# Altium footprint library Package_SO.PcbLib: 333 footprints (part 9 of 21)
Each footprint in its own frame and in the unit in brackets; x right, y up, seen from the top. Pads: shape width x height; smd on the part's side, far side on the other; paste and mask are expansions set on the pad; w line width, h text height; cw(c..) or ccw(c..) is an arc to the next point about the centre after c.
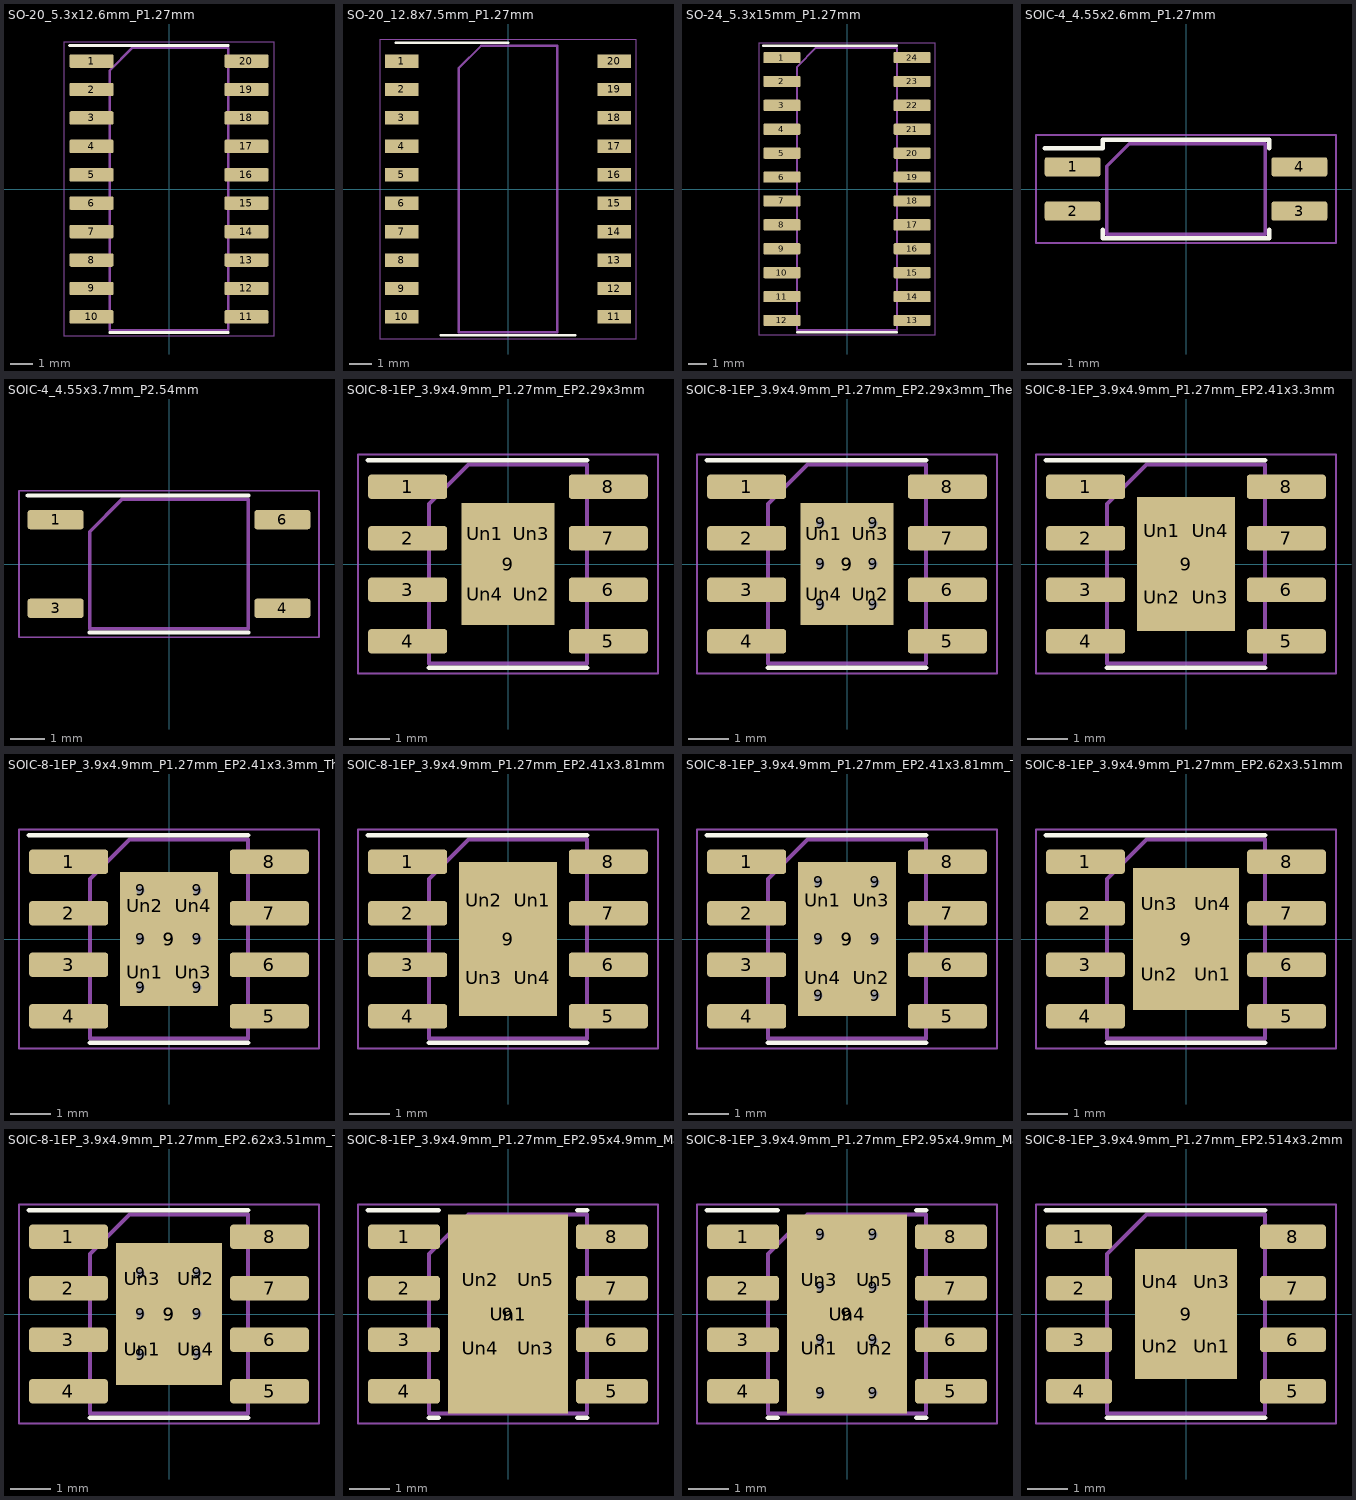
[diagram p8: the footprints below, top view; thin cyan lines are the x and y axes]

## SO-20_5.3x12.6mm_P1.27mm [mm]
pads (20):
  rrect25% 1.975x0.6 smd: 1(-3.463,5.715) 2(-3.463,4.445) 3(-3.463,3.175) 4(-3.463,1.905) 5(-3.463,0.635) 6(-3.463,-0.635) 7(-3.463,-1.905) 8(-3.463,-3.175) 9(-3.463,-4.445) 10(-3.463,-5.715) 11(3.463,-5.715) 12(3.463,-4.445) 13(3.463,-3.175) 14(3.463,-1.905) 15(3.463,-0.635) 16(3.463,0.635) 17(3.463,1.905) 18(3.463,3.175) 19(3.463,4.445) 20(3.463,5.715)
F.SilkS:
  lines w0.12: -4.45,6.41 0,6.41 2.65,6.41 ; -2.65,-6.41 0,-6.41 2.65,-6.41
F.CrtYd:
  lines w0.05: -4.7,-6.55 -4.7,6.55 4.7,6.55 4.7,-6.55 -4.7,-6.55
F.Fab:
  lines w0.1: -2.65,-6.3 -2.65,5.3 -1.65,6.3 2.65,6.3 2.65,-6.3 -2.65,-6.3
  text "'.Designator'" at -4.047,-0.84 h1

## SO-20_12.8x7.5mm_P1.27mm [mm]
pads (20):
  rect 1.5x0.6 smd: 1(-4.75,5.715) 2(-4.75,4.445) 3(-4.75,3.175) 4(-4.75,1.905) 5(-4.75,0.635) 6(-4.75,-0.635) 7(-4.75,-1.905) 8(-4.75,-3.175) 9(-4.75,-4.445) 10(-4.75,-5.715) 11(4.75,-5.715) 12(4.75,-4.445) 13(4.75,-3.175) 14(4.75,-1.905) 15(4.75,-0.635) 16(4.75,0.635) 17(4.75,1.905) 18(4.75,3.175) 19(4.75,4.445) 20(4.75,5.715)
F.SilkS:
  lines w0.12: -5,6.53 0,6.53 ; -3,-6.53 3,-6.53
F.CrtYd:
  lines w0.05: -5.7,-6.7 -5.7,6.7 5.7,6.7 5.7,-6.7 -5.7,-6.7
F.Fab:
  lines w0.1: -2.2,-6.4 -2.2,5.4 -1.2,6.4 2.2,6.4 2.2,-6.4 -2.2,-6.4
  text "'.Designator'" at -4.047,-0.84 h1

## SO-24_5.3x15mm_P1.27mm [mm]
pads (24):
  rrect25% 1.975x0.6 smd: 1(-3.463,6.985) 2(-3.463,5.715) 3(-3.463,4.445) 4(-3.463,3.175) 5(-3.463,1.905) 6(-3.463,0.635) 7(-3.463,-0.635) 8(-3.463,-1.905) 9(-3.463,-3.175) 10(-3.463,-4.445) 11(-3.463,-5.715) 12(-3.463,-6.985) 13(3.463,-6.985) 14(3.463,-5.715) 15(3.463,-4.445) 16(3.463,-3.175) 17(3.463,-1.905) 18(3.463,-0.635) 19(3.463,0.635) 20(3.463,1.905) 21(3.463,3.175) 22(3.463,4.445) 23(3.463,5.715) 24(3.463,6.985)
F.SilkS:
  lines w0.12: -4.45,7.61 0,7.61 2.65,7.61 ; -2.65,-7.61 0,-7.61 2.65,-7.61
F.CrtYd:
  lines w0.05: -4.7,-7.75 4.7,-7.75 4.7,7.75 -4.7,7.75 -4.7,-7.75
F.Fab:
  lines w0.1: -2.65,-7.5 2.65,-7.5 2.65,7.5 -1.65,7.5 -2.65,6.5 -2.65,-7.5
  text "'.Designator'" at -4.047,-0.84 h1

## SOIC-4_4.55x2.6mm_P1.27mm [mm]
pads (4):
  rrect25% 1.6x0.55 smd: 1(-3.25,0.635) 2(-3.25,-0.635) 3(3.25,-0.635) 4(3.25,0.635)
F.SilkS:
  lines w0.12: -4.05,1.17 -2.385,1.17 -2.385,1.41 0,1.41 2.385,1.41 2.385,1.17 ; -2.385,-1.17 -2.385,-1.41 0,-1.41 2.385,-1.41 2.385,-1.17
F.CrtYd:
  lines w0.05: -4.3,-1.55 -4.3,1.55 4.3,1.55 4.3,-1.55 -4.3,-1.55
F.Fab:
  lines w0.1: -2.275,-1.3 -2.275,0.65 -1.625,1.3 2.275,1.3 2.275,-1.3 -2.275,-1.3
  text "'.Designator'" at -4.047,-0.84 h1

## SOIC-4_4.55x3.7mm_P2.54mm [mm]
pads (4):
  rrect25% 1.6x0.55 smd: 1(-3.25,1.27) 3(-3.25,-1.27) 4(3.25,-1.27) 6(3.25,1.27)
F.SilkS:
  lines w0.12: -4.05,1.96 0,1.96 2.275,1.96 ; -2.275,-1.96 0,-1.96 2.275,-1.96
F.CrtYd:
  lines w0.05: -4.3,-2.1 -4.3,2.1 4.3,2.1 4.3,-2.1 -4.3,-2.1
F.Fab:
  lines w0.1: -2.275,-1.85 2.275,-1.85 2.275,1.85 -1.35,1.85 -2.275,0.925 -2.275,-1.85
  text "'.Designator'" at -4.047,-0.84 h1

## SOIC-8-1EP_3.9x4.9mm_P1.27mm_EP2.29x3mm [mm]
pads (13):
  rrect25% 1.95x0.6 smd: 1(-2.475,1.905) 2(-2.475,0.635) 3(-2.475,-0.635) 4(-2.475,-1.905) 5(2.475,-1.905) 6(2.475,-0.635) 7(2.475,0.635) 8(2.475,1.905)
  rect 2.29x3 smd: 9(0,0)
  rrect25% 0.92x1.21 on Top Paste: Un1(-0.57,0.75) Un2(0.57,-0.75) Un3(0.57,0.75) Un4(-0.57,-0.75)
F.SilkS:
  lines w0.12: -3.45,2.56 0,2.56 1.95,2.56 ; -1.95,-2.56 0,-2.56 1.95,-2.56
F.CrtYd:
  lines w0.05: -3.7,-2.7 3.7,-2.7 3.7,2.7 -3.7,2.7 -3.7,-2.7
F.Fab:
  lines w0.1: -1.95,-2.45 -1.95,1.475 -0.975,2.45 1.95,2.45 1.95,-2.45 -1.95,-2.45
  text "'.Designator'" at -3.969,-0.827 h0.98

## SOIC-8-1EP_3.9x4.9mm_P1.27mm_EP2.29x3mm_ThermalVias [mm]
pads (20):
  rrect25% 1.95x0.6 smd: 1(-2.475,1.905) 2(-2.475,0.635) 3(-2.475,-0.635) 4(-2.475,-1.905) 5(2.475,-1.905) 6(2.475,-0.635) 7(2.475,0.635) 8(2.475,1.905)
  round 0.5 hole 0.2: 9(-0.65,-1) 9(-0.65,0) 9(-0.65,1) 9(0.65,-1) 9(0.65,0) 9(0.65,1)
  rect 1.8x2.5 smd far side: 9(0,0)
  rect 2.29x3 smd: 9(0,0)
  rrect25% 0.96x1.25 on Top Paste: Un1(-0.57,0.75) Un2(0.57,-0.75) Un3(0.57,0.75) Un4(-0.57,-0.75)
F.SilkS:
  lines w0.12: -3.45,2.56 0,2.56 1.95,2.56 ; -1.95,-2.56 0,-2.56 1.95,-2.56
F.CrtYd:
  lines w0.05: -3.7,-2.7 -3.7,2.7 3.7,2.7 3.7,-2.7 -3.7,-2.7
F.Fab:
  lines w0.1: -1.95,-2.45 1.95,-2.45 1.95,2.45 -0.975,2.45 -1.95,1.475 -1.95,-2.45
  text "'.Designator'" at -3.969,-0.827 h0.98

## SOIC-8-1EP_3.9x4.9mm_P1.27mm_EP2.41x3.3mm [mm]
pads (13):
  rrect25% 1.95x0.6 smd: 1(-2.475,1.905) 2(-2.475,0.635) 3(-2.475,-0.635) 4(-2.475,-1.905) 5(2.475,-1.905) 6(2.475,-0.635) 7(2.475,0.635) 8(2.475,1.905)
  rect 2.41x3.3 smd: 9(0,0)
  rrect25% 0.97x1.33 on Top Paste: Un1(-0.6,0.825) Un2(-0.6,-0.825) Un3(0.6,-0.825) Un4(0.6,0.825)
F.SilkS:
  lines w0.12: -3.45,2.56 0,2.56 1.95,2.56 ; -1.95,-2.56 0,-2.56 1.95,-2.56
F.CrtYd:
  lines w0.05: -3.7,-2.7 3.7,-2.7 3.7,2.7 -3.7,2.7 -3.7,-2.7
F.Fab:
  lines w0.1: -1.95,-2.45 1.95,-2.45 1.95,2.45 -0.975,2.45 -1.95,1.475 -1.95,-2.45
  text "'.Designator'" at -3.969,-0.827 h0.98

## SOIC-8-1EP_3.9x4.9mm_P1.27mm_EP2.41x3.3mm_ThermalVias [mm]
pads (20):
  rrect25% 1.95x0.6 smd: 1(-2.475,1.905) 2(-2.475,0.635) 3(-2.475,-0.635) 4(-2.475,-1.905) 5(2.475,-1.905) 6(2.475,-0.635) 7(2.475,0.635) 8(2.475,1.905)
  round 0.5 hole 0.2: 9(-0.7,-1.2) 9(-0.7,0) 9(-0.7,1.2) 9(0.7,-1.2) 9(0.7,0) 9(0.7,1.2)
  rect 2.41x3.3 smd: 9(0,0)
  rect 1.9x2.9 smd far side: 9(0,0)
  rrect25% 1.01x1.38 on Top Paste: Un1(-0.6,-0.825) Un2(-0.6,0.825) Un3(0.6,-0.825) Un4(0.6,0.825)
F.SilkS:
  lines w0.12: -3.45,2.56 0,2.56 1.95,2.56 ; -1.95,-2.56 0,-2.56 1.95,-2.56
F.CrtYd:
  lines w0.05: -3.7,-2.7 -3.7,2.7 3.7,2.7 3.7,-2.7 -3.7,-2.7
F.Fab:
  lines w0.1: -1.95,-2.45 -1.95,1.475 -0.975,2.45 1.95,2.45 1.95,-2.45 -1.95,-2.45
  text "'.Designator'" at -3.969,-0.827 h0.98

## SOIC-8-1EP_3.9x4.9mm_P1.27mm_EP2.41x3.81mm [mm]
pads (13):
  rrect25% 1.95x0.6 smd: 1(-2.475,1.905) 2(-2.475,0.635) 3(-2.475,-0.635) 4(-2.475,-1.905) 5(2.475,-1.905) 6(2.475,-0.635) 7(2.475,0.635) 8(2.475,1.905)
  rect 2.41x3.81 smd: 9(0,0)
  rrect25% 0.97x1.54 on Top Paste: Un1(0.6,0.95) Un2(-0.6,0.95) Un3(-0.6,-0.95) Un4(0.6,-0.95)
F.SilkS:
  lines w0.12: -3.45,2.56 0,2.56 1.95,2.56 ; -1.95,-2.56 0,-2.56 1.95,-2.56
F.CrtYd:
  lines w0.05: -3.7,-2.7 3.7,-2.7 3.7,2.7 -3.7,2.7 -3.7,-2.7
F.Fab:
  lines w0.1: -1.95,-2.45 -1.95,1.475 -0.975,2.45 1.95,2.45 1.95,-2.45 -1.95,-2.45
  text "'.Designator'" at -3.969,-0.827 h0.98

## SOIC-8-1EP_3.9x4.9mm_P1.27mm_EP2.41x3.81mm_ThermalVias [mm]
pads (20):
  rrect25% 1.95x0.6 smd: 1(-2.475,1.905) 2(-2.475,0.635) 3(-2.475,-0.635) 4(-2.475,-1.905) 5(2.475,-1.905) 6(2.475,-0.635) 7(2.475,0.635) 8(2.475,1.905)
  round 0.5 hole 0.2: 9(-0.7,-1.4) 9(-0.7,0) 9(-0.7,1.4) 9(0.7,-1.4) 9(0.7,0) 9(0.7,1.4)
  rect 1.9x3.3 smd far side: 9(0,0)
  rect 2.41x3.81 smd: 9(0,0)
  rrect25% 1.01x1.59 on Top Paste: Un1(-0.6,0.95) Un2(0.6,-0.95) Un3(0.6,0.95) Un4(-0.6,-0.95)
F.SilkS:
  lines w0.12: -3.45,2.56 0,2.56 1.95,2.56 ; -1.95,-2.56 0,-2.56 1.95,-2.56
F.CrtYd:
  lines w0.05: -3.7,-2.7 -3.7,2.7 3.7,2.7 3.7,-2.7 -3.7,-2.7
F.Fab:
  lines w0.1: -1.95,-2.45 1.95,-2.45 1.95,2.45 -0.975,2.45 -1.95,1.475 -1.95,-2.45
  text "'.Designator'" at -3.969,-0.827 h0.98

## SOIC-8-1EP_3.9x4.9mm_P1.27mm_EP2.62x3.51mm [mm]
pads (13):
  rrect25% 1.94x0.6 smd: 1(-2.48,1.905) 2(-2.48,0.635) 3(-2.48,-0.635) 4(-2.48,-1.905) 5(2.48,-1.905) 6(2.48,-0.635) 7(2.48,0.635) 8(2.48,1.905)
  rect 2.62x3.51 smd: 9(0,0)
  rrect24% 1.06x1.41 on Top Paste: Un1(0.655,-0.875) Un2(-0.655,-0.875) Un3(-0.655,0.875) Un4(0.655,0.875)
F.SilkS:
  lines w0.12: -3.45,2.56 0,2.56 1.95,2.56 ; -1.95,-2.56 0,-2.56 1.95,-2.56
F.CrtYd:
  lines w0.05: -3.7,-2.7 -3.7,2.7 3.7,2.7 3.7,-2.7 -3.7,-2.7
F.Fab:
  lines w0.1: -1.95,-2.45 -1.95,1.475 -0.975,2.45 1.95,2.45 1.95,-2.45 -1.95,-2.45
  text "'.Designator'" at -3.969,-0.827 h0.98

## SOIC-8-1EP_3.9x4.9mm_P1.27mm_EP2.62x3.51mm_ThermalVias [mm]
pads (20):
  rrect25% 1.94x0.6 smd: 1(-2.48,1.905) 2(-2.48,0.635) 3(-2.48,-0.635) 4(-2.48,-1.905) 5(2.48,-1.905) 6(2.48,-0.635) 7(2.48,0.635) 8(2.48,1.905)
  round 0.5 hole 0.2: 9(-0.7,-1) 9(-0.7,0) 9(-0.7,1) 9(0.7,-1) 9(0.7,0) 9(0.7,1)
  rect 2.62x3.51 smd: 9(0,0)
  rect 1.9x2.5 smd far side: 9(0,0)
  rrect23% 1.1x1.47 on Top Paste: Un1(-0.655,-0.875) Un2(0.655,0.875) Un3(-0.655,0.875) Un4(0.655,-0.875)
F.SilkS:
  lines w0.12: -3.45,2.56 0,2.56 1.95,2.56 ; -1.95,-2.56 0,-2.56 1.95,-2.56
F.CrtYd:
  lines w0.05: -3.7,-2.7 3.7,-2.7 3.7,2.7 -3.7,2.7 -3.7,-2.7
F.Fab:
  lines w0.1: -1.95,-2.45 1.95,-2.45 1.95,2.45 -0.975,2.45 -1.95,1.475 -1.95,-2.45
  text "'.Designator'" at -3.969,-0.827 h0.98

## SOIC-8-1EP_3.9x4.9mm_P1.27mm_EP2.95x4.9mm_Mask2.71x3.4mm [mm]
pads (14):
  rrect25% 1.775x0.6 smd: 1(-2.562,1.905) 2(-2.562,0.635) 3(-2.562,-0.635) 4(-2.562,-1.905) 5(2.562,-1.905) 6(2.562,-0.635) 7(2.562,0.635) 8(2.562,1.905)
  rect 2.95x4.9 smd: 9(0,0)
  rect 2.71x3.4 on Top Solder: Un1(0,0)
  rrect23% 1.09x1.37 on Top Paste: Un2(-0.68,0.85) Un3(0.68,-0.85) Un4(-0.68,-0.85) Un5(0.68,0.85)
F.SilkS:
  lines w0.12: -3.45,2.56 -1.711,2.56 ; -1.95,-2.56 -1.711,-2.56 ; 1.711,-2.56 1.95,-2.56 ; 1.711,2.56 1.95,2.56
F.CrtYd:
  lines w0.05: -3.7,-2.7 -3.7,2.7 3.7,2.7 3.7,-2.7 -3.7,-2.7
F.Fab:
  lines w0.1: -1.95,-2.45 -1.95,1.475 -0.975,2.45 1.95,2.45 1.95,-2.45 -1.95,-2.45
  text "'.Designator'" at -3.969,-0.827 h0.98

## SOIC-8-1EP_3.9x4.9mm_P1.27mm_EP2.95x4.9mm_Mask2.71x3.4mm_ThermalVias [mm]
pads (23):
  rrect25% 1.775x0.6 smd: 1(-2.562,1.905) 2(-2.562,0.635) 3(-2.562,-0.635) 4(-2.562,-1.905) 5(2.562,-1.905) 6(2.562,-0.635) 7(2.562,0.635) 8(2.562,1.905)
  round 0.5 hole 0.2: 9(-0.65,-1.95) 9(-0.65,-0.65) 9(-0.65,0.65) 9(-0.65,1.95) 9(0.65,-1.95) 9(0.65,-0.65) 9(0.65,0.65) 9(0.65,1.95)
  rect 1.8x4.4 smd far side: 9(0,0)
  rect 2.95x4.9 smd: 9(0,0)
  rrect22% 1.13x1.42 on Top Paste: Un1(-0.68,-0.85) Un2(0.68,-0.85) Un3(-0.68,0.85) Un5(0.68,0.85)
  rect 2.71x3.4 on Top Solder: Un4(0,0)
F.SilkS:
  lines w0.12: -3.45,2.56 -1.711,2.56 ; -1.95,-2.56 -1.711,-2.56 ; 1.711,-2.56 1.95,-2.56 ; 1.711,2.56 1.95,2.56
F.CrtYd:
  lines w0.05: -3.7,-2.7 3.7,-2.7 3.7,2.7 -3.7,2.7 -3.7,-2.7
F.Fab:
  lines w0.1: -1.95,-2.45 -1.95,1.475 -0.975,2.45 1.95,2.45 1.95,-2.45 -1.95,-2.45
  text "'.Designator'" at -3.969,-0.827 h0.98

## SOIC-8-1EP_3.9x4.9mm_P1.27mm_EP2.514x3.2mm [mm]
pads (13):
  rrect25% 1.625x0.6 smd: 1(-2.638,1.905) 2(-2.638,0.635) 3(-2.638,-0.635) 4(-2.638,-1.905) 5(2.638,-1.905) 6(2.638,-0.635) 7(2.638,0.635) 8(2.638,1.905)
  rect 2.514x3.2 smd: 9(0,0)
  rrect25% 1.01x1.29 on Top Paste: Un1(0.63,-0.8) Un2(-0.63,-0.8) Un3(0.63,0.8) Un4(-0.63,0.8)
F.SilkS:
  lines w0.12: -3.45,2.56 0,2.56 1.95,2.56 ; -1.95,-2.56 0,-2.56 1.95,-2.56
F.CrtYd:
  lines w0.05: -3.7,-2.7 3.7,-2.7 3.7,2.7 -3.7,2.7 -3.7,-2.7
F.Fab:
  lines w0.1: -1.95,-2.45 1.95,-2.45 1.95,2.45 -0.975,2.45 -1.95,1.475 -1.95,-2.45
  text "'.Designator'" at -3.969,-0.827 h0.98